# Altium footprint library Sajad_Altium_Library.PcbLib: 333 footprints (part 16 of 21)
Each footprint in its own frame and in the unit in brackets; x right, y up, seen from the top. Pads: shape width x height; smd on the part's side, far side on the other; paste and mask are expansions set on the pad; w line width, h text height; cw(c..) or ccw(c..) is an arc to the next point about the centre after c.
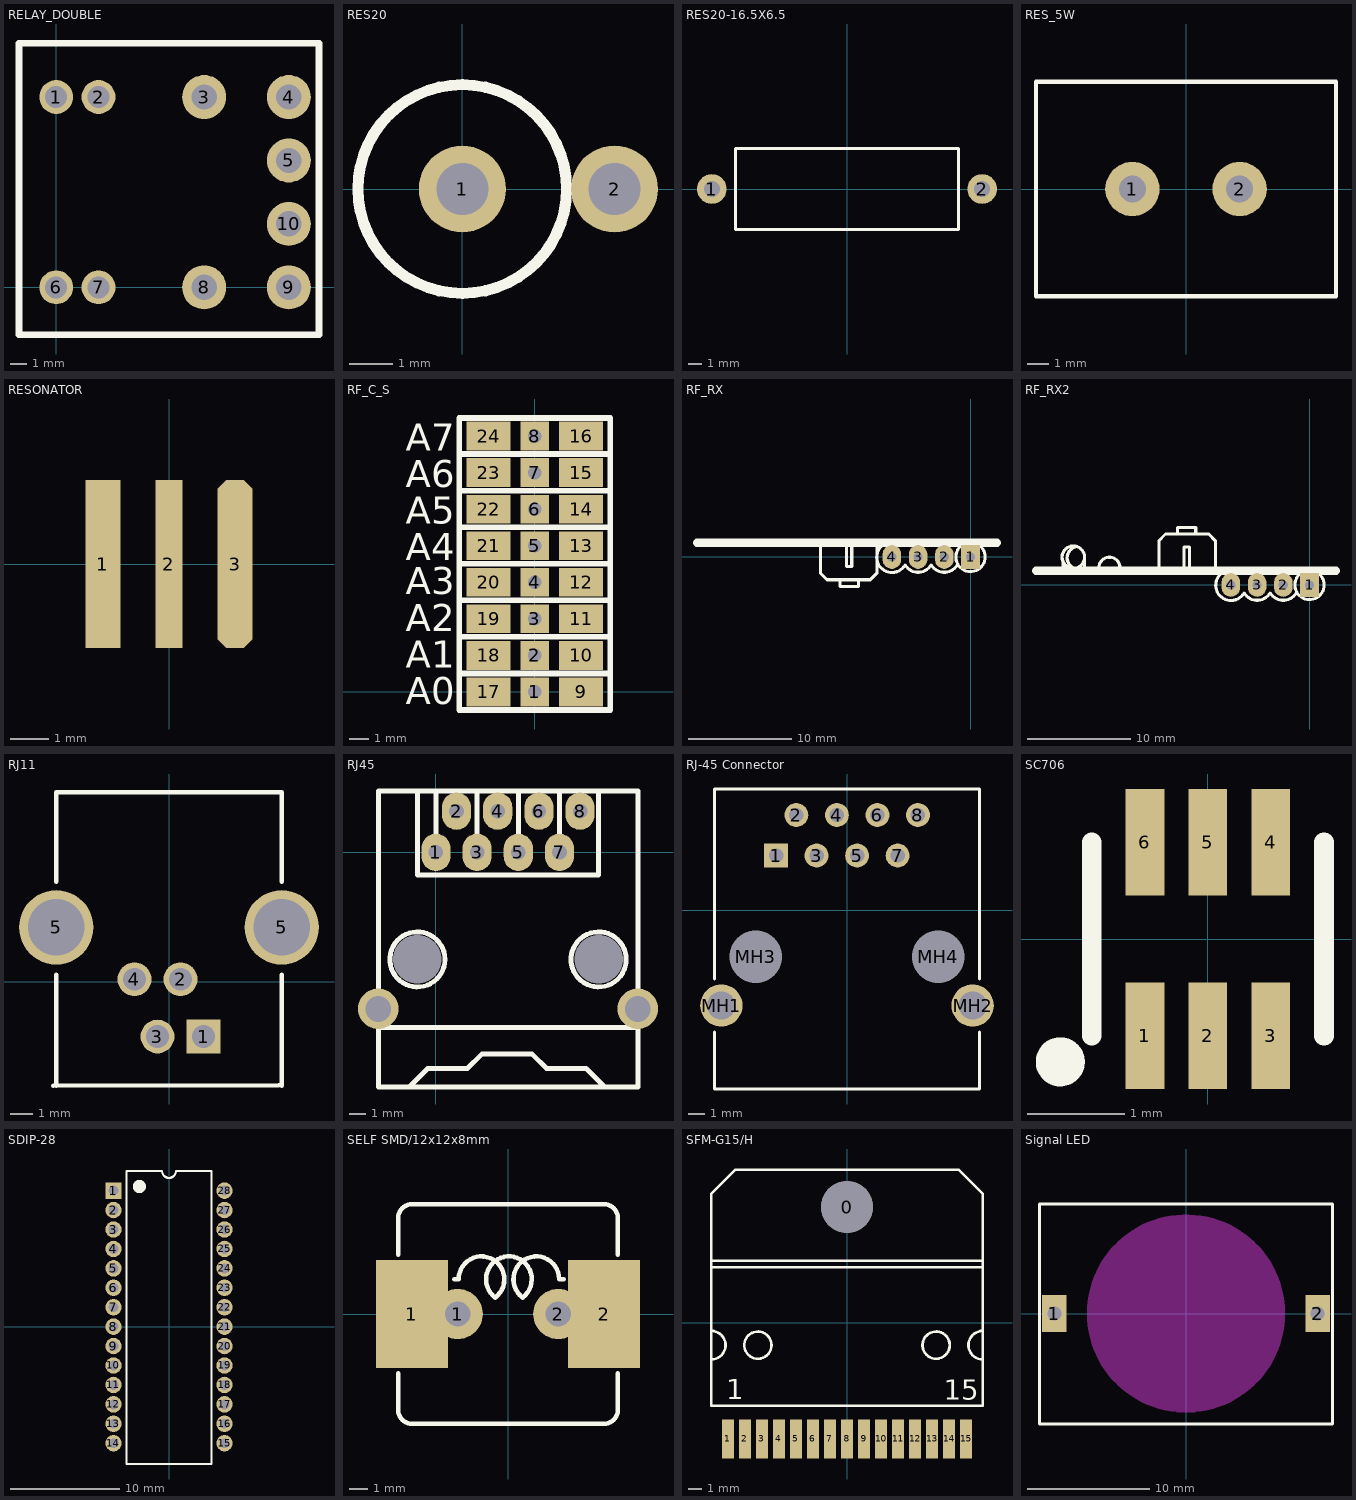
[diagram p15: the footprints below, top view; thin cyan lines are the x and y axes]

## RELAY_DOUBLE [mm] "JQC-16F"
pads (10):
  round 2 hole 1.3: 1(0,11.25) 2(2.5,11.25) 6(0,0) 7(2.5,0)
  round 2.6 hole 1.5: 3(8.75,11.25) 4(13.75,11.25) 5(13.75,7.5) 8(8.75,0) 9(13.75,0) 10(13.75,3.75)
Top Overlay:
  lines w0.4: -2.2,-2.8 15.535,-2.8 15.535,14.425 -2.2,14.425 -2.2,-2.8
3D body: height 13, standoff 0, extent -1.994,-2.649 15.506,14.351

## RES20 [mm] "Resistor, Axial; Body 16.5 x 6.5 mm (LxDia. max), Lead Dia. 0.85 mm (max)"
height 6.5
pads (2):
  round 2 hole 1.2: 1(0,0) 2(3.5,0)
Top Overlay:
  circle w0.254: c0,0 r2.4
3D body: height 7.62, standoff -1.91, extent -1.206,-1.27 2.73,1.016

## RES20-16.5X6.5 [mm] "Resistor, Axial; Body 16.5 x 6.5 mm (LxDia. max), Lead Dia. 0.85 mm (max)"
height 6.5
pads (2):
  round 2.2 hole 1.2: 1(-10,0) 2(10,0)
Top Overlay:
  lines w0.2: -8.25,-3 8.25,-3 8.25,3 -8.25,3 -8.25,-3
3D body: height 8.3, standoff -2, extent -11.1,-3.175 11.1,3.425

## RES_5W [mm]
height 6.5
pads (2):
  round 2.54 hole 1.27: 1(-2.5,0) 2(2.5,0)
Top Overlay:
  lines w0.2: -7,-5 -7,5 7,5 7,-5 -7,-5

## RESONATOR [mm]
height 1.76
pads (3):
  rect 0.9x4.318 smd: 1(-1.7,0)
  rect 0.7x4.318 smd: 2(0,0)
  oct 0.9x4.318 smd: 3(1.7,0)

## RF_C_S [mm]
pads (24):
  rect 1.5x1.5 hole 0.7: 1(0,0) 2(0,1.905) 3(0,3.81) 4(0,5.715) 5(0,7.62) 6(0,9.525) 7(0,11.43) 8(0,13.335)
  rect 2.3x1.5 smd: 9(2.413,0) 10(2.413,1.905) 11(2.413,3.81) 12(2.413,5.715) 13(2.413,7.62) 14(2.413,9.525) 15(2.413,11.43) 16(2.413,13.335) 17(-2.413,0) 18(-2.413,1.905) 19(-2.413,3.81) 20(-2.413,5.715) 21(-2.413,7.62) 22(-2.413,9.525) 23(-2.413,11.43) 24(-2.413,13.335)
Top Overlay:
  lines w0.3: -3.937,0.965 3.937,0.965 ; -3.937,2.87 3.937,2.87 ; -3.937,4.775 3.937,4.775 ; -3.937,6.68 3.937,6.68 ; -3.937,8.585 3.937,8.585 ; -3.937,10.49 3.937,10.49 ; -3.937,12.395 3.937,12.395 ; -3.937,-0.94 3.937,-0.94 3.937,14.275 -3.937,14.275 -3.937,-0.94
  text "A7" at -6.731,12.573 h1.4
  text "A6" at -6.731,10.668 h1.4
  text "A5" at -6.731,8.763 h1.4
  text "A4" at -6.731,6.858 h1.4
  text "A3" at -6.731,5.08 h1.4
  text "A2" at -6.731,3.175 h1.4
  text "A1" at -6.731,1.27 h1.4
  text "A0" at -6.731,-0.635 h1.4

## RF_RX [mm]
pads (4):
  rect 1.8x2.3 hole 0.9: 1(0,0)
  oval 1.8x2.3 hole 0.9: 2(-2.54,0) 3(-5.08,0) 4(-7.62,0)
Top Overlay:
  circle w0.3: c0,0 r1.42
  lines w0.3: -14.529,1.473 -14.529,-1.575 -13.894,-2.21 -9.703,-2.21 -9.068,-1.575 -9.068,1.473 ; -12.624,-2.21 -12.624,-2.845 -10.846,-2.845 -10.846,-2.21 ; -12.014,1.473 -12.014,-0.94 -11.506,-0.94 -11.506,1.473 ; -6.836,1.242 ccw(c-7.606,-0.023) -6.336,-0.785 ; -6.35,-0.762 ccw(c-5.08,0) -3.81,-0.762 ccw(c-2.54,0) -1.27,-0.762
  lines w0.8: -26.492,1.372 2.565,1.372

## RF_RX2 [mm]
pads (4):
  rect 1.8x2.3 hole 0.9: 1(0,0)
  oval 1.8x2.3 hole 0.9: 2(-2.54,0) 3(-5.08,0) 4(-7.62,0)
Top Overlay:
  circle w0.3: c0,0 r1.42
  circle w0.305: c-22.878,2.692 r1.085
  lines w0.3: -23.894,1.499 -23.894,2.311 ; -21.793,1.568 -21.793,2.692 ; -14.58,1.245 -14.58,4.293 -13.945,4.928 -9.754,4.928 -9.119,4.293 -9.119,1.245 ; -12.802,4.928 -12.802,5.563 -11.024,5.563 -11.024,4.928 ; -12.141,1.245 -12.141,3.658 -11.633,3.658 -11.633,1.245 ; -6.836,1.242 ccw(c-7.606,-0.023) -6.336,-0.785 ; -6.35,-0.762 ccw(c-5.08,0) -3.81,-0.762 ccw(c-2.54,0) -1.27,-0.762
  lines w0.305: -22.518,1.551 cw(c-22.389,2.629) -22.497,3.708 ; -20.396,1.676 cw(c-19.38,1.676) -18.364,1.676
  lines w0.8: -26.492,1.372 2.565,1.372

## RJ11 [mm] "RJ11 CONNECTOR"
height 11.58
pads (6):
  rect 1.5x1.5 hole 1.016: 1(1.53,-2.42)
  round 1.5 hole 1.016: 2(0.51,0.12) 3(-0.51,-2.42) 4(-1.53,0.12)
  round 3.3 hole 2.5 unplated: 5(-5,2.42) 5(5,2.42)
Top Overlay:
  lines w0.2: -5.127,-4.611 4.873,-4.58 ; -5,-4.611 -5,0.326 ; -5,4.445 -5,8.42 5,8.42 5,4.445 ; 5,-4.611 5,0.326

## RJ45 [mm]
pads (12):
  oval 1.8x2.3 hole 0.9: 1(0,0) 2(1.27,2.54) 3(2.54,0) 4(3.81,2.54) 5(5.08,0) 6(6.35,2.54) 7(7.62,0) 8(8.89,2.54)
  round 2.5 hole 1.6: ""(-3.556,-9.652) ""(12.446,-9.652)
  round 2.54 hole 3: ""(-1.143,-6.604) ""(10.033,-6.604)
Top Overlay:
  circle w0.3: c10.033,-6.604 r1.7
  circle w0.3: c-1.143,-6.604 r1.7
  lines w0.305: -3.531,-10.795 12.471,-10.795 ; -1.651,-14.478 -0.508,-13.335 1.937,-13.335 2.826,-12.446 5.937,-12.446 6.826,-13.335 9.271,-13.335 10.414,-14.478 ; -1.143,3.785 -1.143,-1.397 10.033,-1.397 10.033,3.785 ; 0,0.381 0,3.785 ; 1.27,3.048 1.27,3.785 ; 2.54,0.381 2.54,3.785 ; 3.81,2.921 3.81,3.785 ; 5.08,0.381 5.08,3.785 ; 6.35,2.921 6.35,3.785 ; 7.62,0.381 7.62,3.785 ; 8.89,2.921 8.89,3.785 ; -3.531,-14.478 -3.531,3.785 12.471,3.785 12.471,-14.478 -3.531,-14.478

## RJ-45 Connector [mm] "LAN Conector"
pads (12):
  rect 1.5x1.5 hole 0.9: 1(-4.445,3.43)
  round 1.5 hole 0.9: 2(-3.175,5.97) 3(-1.905,3.43) 4(-0.635,5.97) 5(0.635,3.43) 6(1.905,5.97) 7(3.175,3.43) 8(4.445,5.97)
  round 2.65 hole 1.778: MH1(-7.875,-5.97) MH2(7.875,-5.97)
  round 2.95 hole 3.302 unplated: MH3(-5.715,-2.92) MH4(5.715,-2.92)
Top Overlay:
  lines w0.2: -8.3,-7.642 -8.3,-11.2 8.3,-11.2 8.3,-7.642 ; -8.3,-4.298 -8.3,7.6 8.3,7.6 8.3,-4.298

## SC706 [mm]
pads (6):
  rect 0.4x1.1 smd: 1(-0.65,-1) 2(0,-1) 3(0.65,-1) 4(0.65,1) 5(0,1) 6(-0.65,1)
Top Overlay:
  circle w0.254: c-1.524,-1.27 r0.127
  lines w0.203: -1.2,-1 -1.2,1 ; 1.2,-1 1.2,1

## SDIP-28 [mm] "DIP, Plastic, 28-Pin, Row Spacing 10.16 mm, Pitch 1.778 mm"
height 5.08
pads (28):
  rect 1.5x1.5 hole 0.9: 1(-5.08,12.446)
  round 1.5 hole 0.9: 2(-5.08,10.668) 3(-5.08,8.89) 4(-5.08,7.112) 5(-5.08,5.334) 6(-5.08,3.556) 7(-5.08,1.778) 8(-5.08,0) 9(-5.08,-1.778) 10(-5.08,-3.556) 11(-5.08,-5.334) 12(-5.08,-7.112) 13(-5.08,-8.89) 14(-5.08,-10.668) 15(5.08,-10.668) 16(5.08,-8.89) 17(5.08,-7.112) 18(5.08,-5.334) 19(5.08,-3.556) 20(5.08,-1.778) 21(5.08,0) 22(5.08,1.778) 23(5.08,3.556) 24(5.08,5.334) 25(5.08,7.112) 26(5.08,8.89) 27(5.08,10.668) 28(5.08,12.446)
Top Overlay:
  circle w0.6: c-2.713,12.827 r0.3
  lines w0.2: -3.9,-12.573 3.9,-12.573 3.9,14.25 0.635,14.25 cw(c0,14.25) -0.635,14.25 -3.9,14.25 -3.9,-12.573

## SELF SMD/12x12x8mm [mil]
pads (4):
  rect 157.48x236.22 smd: 1(-210,0) 2(210,0)
  round 110 hole 55: 1(-110,0) 2(110,0)
Top Overlay:
  lines w10: -240,-130 -240,-210 ccw(c-210,-210) -210,-240 210,-240 ccw(c210,-210) 240,-210 240,-130 ; -240,130 -240,210 cw(c-210,210) -210,240 210,240 cw(c210,210) 240,210 ; -118,76 -108,76 cw(c-58,76) -28,36 cw(c2,76) 32,36 cw(c62,76) 112,76 122,76 ; 240,130 240,210 ; 240,195 240,210

## SFM-G15/H [mm] "TO, SM, Horizontal, Heatsink Mounted; 15 Leads; Pitch 1.27 mm"
height 4.62
pads (16):
  round 3.86 hole 3.86: 0(0,8.66)
  rect 0.9x2.9 smd: 1(-8.89,-8.66) 2(-7.62,-8.66) 3(-6.35,-8.66) 4(-5.08,-8.66) 5(-3.81,-8.66) 6(-2.54,-8.66) 7(-1.27,-8.66) 8(0,-8.66) 9(1.27,-8.66) 10(2.54,-8.66) 11(3.81,-8.66) 12(5.08,-8.66) 13(6.35,-8.66) 14(7.62,-8.66) 15(8.89,-8.66)
Top Overlay:
  circle w0.2: c6.656,-1.656 r1.016
  circle w0.2: c-6.656,-1.656 r1.016
  lines w0.2: -10.135,-2.722 ccw(c-10.135,-1.656) -10.135,-0.59 ; -10.135,4.17 10.135,4.17 ; -10.135,4.64 10.135,4.64 ; 10.13,9.66 8.34,11.45 -8.34,11.45 -10.13,9.66 -10.135,9.66 -10.135,-6.18 10.135,-6.18 10.135,9.66 ; 10.135,-2.722 cw(c10.135,-1.656) 10.135,-0.59
  text "15" at 7.223,-5.741 h1.5
  text "1" at -9.012,-5.701 h1.5
3D body: height 5, standoff -1.5, extent -9.8,-12.167 9.8,11.433

## Signal LED [mm] "Signal_led"
pads (2):
  rect 2x3 hole 1.143: 1(-10.794,0) 2(10.794,0)
Top Overlay:
  lines w0.254: -12,-9.04 12,-9.04 12,8.96 -12,8.96 -12,-9.04
Keep-Out Layer:
  circle w0.254: c0,0 r8
  board cut-out: -8.013,0 -7.962,-0.897 -7.812,-1.783 -7.563,-2.646 -7.219,-3.477 -6.784,-4.263 -6.265,-4.996 -5.666,-5.666 -4.996,-6.265 -4.263,-6.784 -3.477,-7.219 -2.646,-7.563 -1.783,-7.812 -0.897,-7.962 0,-8.013 0.897,-7.962 1.783,-7.812 2.646,-7.563 3.477,-7.219 4.263,-6.784 4.996,-6.265 5.666,-5.666 6.265,-4.996 6.784,-4.263 7.219,-3.477 7.563,-2.646 7.812,-1.783 7.962,-0.897 8.013,0 7.962,0.897 7.812,1.783 7.563,2.646 7.219,3.477 6.784,4.263 6.265,4.996 5.666,5.666 4.996,6.265 4.263,6.784 3.477,7.219 2.646,7.563 1.783,7.812 0.897,7.962 0,8.013 -0.897,7.962 -1.783,7.812 -2.646,7.563 -3.477,7.219 -4.263,6.784 -4.996,6.265 -5.666,5.666 -6.265,4.996 -6.784,4.263 -7.219,3.477 -7.563,2.646 -7.812,1.783 -7.962,0.897